# Altium footprint library Connectors USB.PcbLib: 22 footprints (part 1 of 2)
Each footprint in its own frame and in the unit in brackets; x right, y up, seen from the top. Pads: shape width x height; smd on the part's side, far side on the other; paste and mask are expansions set on the pad; w line width, h text height; cw(c..) or ccw(c..) is an arc to the next point about the centre after c.
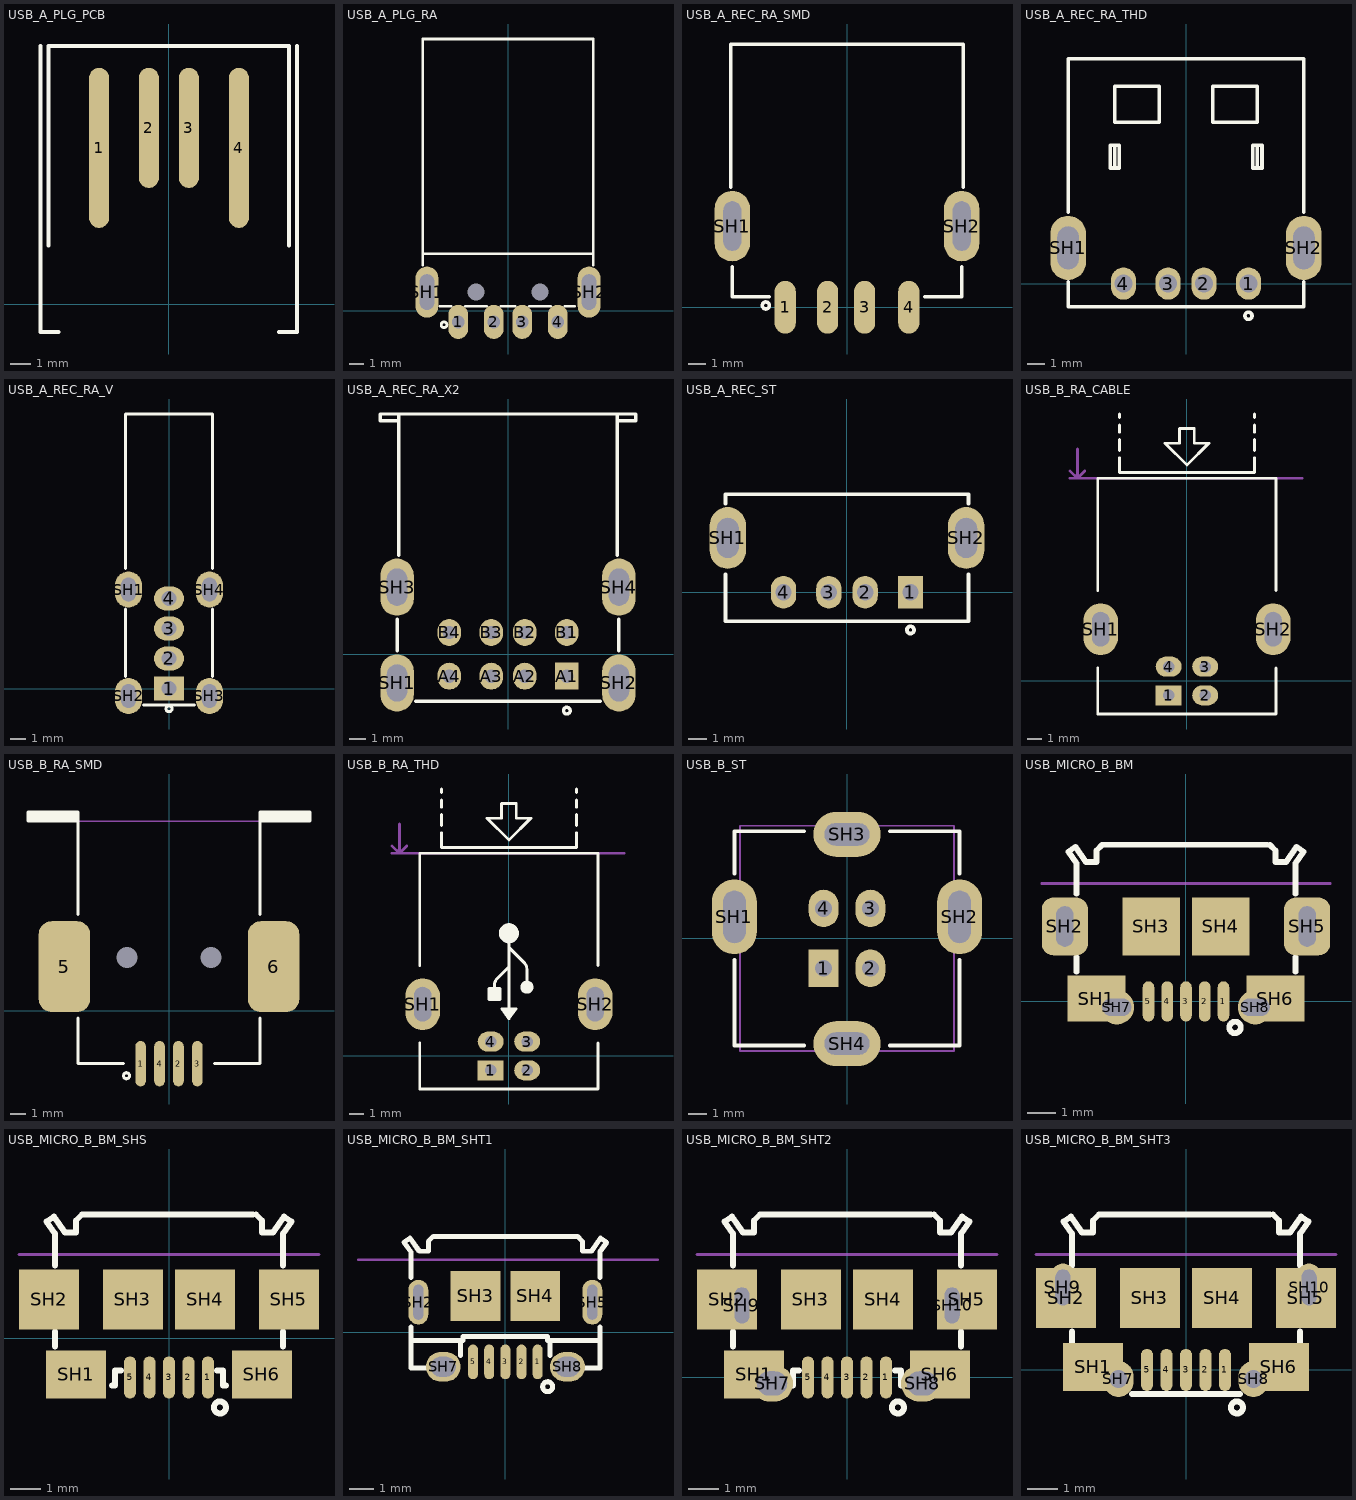
[diagram p0: the footprints below, top view; thin cyan lines are the x and y axes]

## USB_A_PLG_PCB [mm]
height 6.5
pads (4):
  oval 1x8 smd: 1(-3.485,7.8) 4(3.5,7.8)
  oval 1x6 smd: 2(-1,8.8) 3(1,8.8)
Top Overlay:
  lines w0.2: -6.4,12.9 -6.4,-1.4 -5.5,-1.4 ; -6,2.933 -6,12.9 6,12.9 6,2.933 ; 5.5,-1.4 6.4,-1.4 6.4,12.9

## USB_A_PLG_RA [mm] "CONN, USB, Type A, PLUG, Right Angle, SMD, THD"
height 4.5
pads (8):
  oval 1.4x2.4 / inner oval 1.4x1.8 / far side oval 1.4x1.8 hole 0.9 mask+0.1: 1(-3.5,-0.8) 2(-1,-0.8) 3(1,-0.8) 4(3.5,-0.8)
  oval 1.6x3.6 hole 1 slot 2.5 at 90 deg: SH1(-5.7,1.3) SH2(5.7,1.3)
  round 0.8 hole 1.2 unplated: ""(-2.25,1.3) ""(2.25,1.3)
Top Overlay:
  circle w0.2: c-4.5,-1 r0.2
  lines w0.2: -6,3.2 -6,19.1 6,19.1 6,3.2 ; -6,4 6,4 ; -4.8,0.3 -4,0.3 ; -3,0.3 -1.5,0.3 ; -0.5,0.3 0.5,0.3 ; 1.5,0.3 3,0.3 ; 4,0.3 4.7,0.3
Mechanical 1:
  lines w0.1: -6,4 6,4
  text "PCB Edge" at 5.173,4.473 h0.25
3D body "14381.STEP": height 3.13, standoff -2.67, extent -6.303,-1.3 6.303,19

## USB_A_REC_RA_SMD [mm] "CONN, USB A, Receptacle, RIGHT ANGLE, SMD"
pads (6):
  oval 1.2x3 smd: 1(-3.5,0) 2(-1.1,0) 3(1,0) 4(3.5,0)
  oval 2x4 hole 1 slot 2.8 at 90 deg: SH1(-6.5,4.6) SH2(6.5,4.6)
Top Overlay:
  circle w0.2: c-4.6,0.1 r0.2
  lines w0.2: -6.6,6.8 -6.6,14.9 6.6,14.9 6.6,6.8 ; -6.5,2.3 -6.5,0.6 -4.4,0.6 ; 4.4,0.6 6.5,0.6 6.5,2.3
3D body "USB MADEGI SMD .stp": height 7.7, standoff -2.62, extent -7.3,-0.206 7.2,14.806

## USB_A_REC_RA_THD [mm] "CONN, USB A, Receptacle, RIGHT ANGLE, THD"
height 7
pads (6):
  oval 1.4x1.8 hole 1: 1(3.5,0) 2(1,0) 3(-1,0) 4(-3.5,0)
  oval 2x3.6 hole 1.2 slot 2.4 at 90 deg: SH1(-6.6,2) SH2(6.6,2)
Top Overlay:
  circle w0.2: c3.5,-1.8 r0.2
  lines w0.2: -6.6,0.1 -6.6,-1.3 6.6,-1.3 6.6,0.1 ; -6.6,4 -6.6,12.6 6.6,12.6 6.6,4 ; -3.995,6.475 -4.249,6.475 -4.249,7.745 -3.995,7.745 ; -3.995,6.475 -3.741,6.475 -3.741,7.745 -3.995,7.745 ; -3.995,6.475 -3.995,7.745 ; 4,6.475 3.746,6.475 3.746,7.745 4,7.745 ; 4,6.475 4.255,6.475 4.255,7.745 4,7.745 ; 4,6.475 4,7.745 ; -3.995,9.047 -3.995,11.047 -1.495,11.047 -1.495,9.047 -3.995,9.047 ; 1.5,9.047 1.5,11.047 4,11.047 4,9.047 1.5,9.047
3D body "User Library-USB-A-01.step": height 6.95, standoff -4.2, extent -7.9,-1.2 7.9,12.5

## USB_A_REC_RA_V [mm] "CONN, USB A, Right Angle, VERTICAL, THD"
height 13.83
pads (8):
  rect 2x1.6 hole 1: 1(0,0)
  oval 2x1.6 hole 1: 2(0,2) 3(0,4) 4(0,6)
  oval 1.8x2.4 hole 1 slot 1.6 at 90 deg: SH1(-2.7,6.6) SH2(-2.7,-0.5) SH3(2.7,-0.5) SH4(2.7,6.6)
Top Overlay:
  circle w0.2: c0,-1.35 r0.2
  lines w0.2: -2.9,0.8 -2.9,5.3 ; -2.9,8 -2.9,18.3 2.9,18.3 2.9,8 ; -1.7,-1.1 1.7,-1.1 ; 2.9,0.8 2.9,5.3
3D body "usb_a-usb_a-e.stp": height 14.25, standoff -3.9, extent -3.556,-1.025 3.564,18.225

## USB_A_REC_RA_X2 [mm] "CONN, USB A, Right Angle, DUAL"
height 15.82
pads (12):
  rect 1.4x1.6 hole 0.8: A1(3.5,-1.3)
  oval 1.4x1.6 hole 0.8: A2(1,-1.3) A3(-1,-1.3) A4(-3.5,-1.3) B1(3.5,1.3) B2(1,1.3) B3(-1,1.3) B4(-3.5,1.3)
  oval 2x3.4 hole 1.2 slot 2.2 at 90 deg: SH1(-6.6,-1.7) SH2(6.6,-1.7) SH3(-6.6,4) SH4(6.6,4)
Top Overlay:
  circle w0.2: c3.5,-3.35 r0.2
  lines w0.2: -6.6,0.2 -6.6,2.1 ; -6.5,5.9 -6.5,14.3 ; -6.5,13.9 -7.6,13.9 -7.6,14.3 -6.5,14.3 ; -5.5,-2.8 5.5,-2.8 ; 6.5,5.9 6.5,14.3 ; 6.5,13.9 7.6,13.9 7.6,14.3 6.5,14.3 ; 6.6,0.2 6.6,2.1 ; -6.5,14.3 6.5,14.3
Mechanical 1:
  lines w0.1: -6.57,14.3 6.57,14.3
  text "PCB Edge" at 6.15,13.932 h0.2
3D body "14378.STEP": height 16.3, standoff -3.1, extent -7.851,-2.7 7.849,14.898

## USB_A_REC_ST [mm] "CONN, USB A, Receptacle, STRAIGHT, THD"
height 15
pads (6):
  rect 1.4x1.8 hole 0.9: 1(3.5,0)
  oval 1.4x1.8 hole 0.9: 2(1,0) 3(-1,0) 4(-3.5,0)
  oval 2x3.4 hole 1.2 slot 2.2 at 90 deg: SH1(-6.57,3) SH2(6.57,3)
Top Overlay:
  circle w0.2: c3.5,-2.075 r0.2
  lines w0.2: -6.7,1 -6.7,-1.6 6.7,-1.6 6.7,1 ; -6.7,4.9 -6.7,5.4 6.7,5.4 6.7,4.9
3D body "14382.STEP": height 14, standoff -3.99, extent -7.992,-2.365 7.992,5.275

## USB_B_RA_CABLE [mm] "CONN, USB B, Receptacle, RIGHT ANGLE, THD"
height 11.1
pads (6):
  rect 1.8x1.4 hole 0.8: 1(-1.27,-1)
  oval 1.8x1.4 hole 0.8: 2(1.27,-1) 3(1.27,1) 4(-1.27,1)
  oval 2.4x3.6 hole 1.2 slot 2.4 at 90 deg: SH1(-6,3.6) SH2(6,3.6)
Top Overlay:
  lines w0.2: -6.2,0.9 -6.2,-2.3 6.2,-2.3 6.2,0.9 ; -6.2,6.3 -6.2,14.1 6.2,14.1 6.2,6.3 ; -4.699,15.524 -4.699,14.508 4.699,14.508 4.699,15.524 ; -4.699,16.032 -4.699,16.794 ; -4.699,17.302 -4.699,17.81 ; -4.699,18.318 -4.699,18.572 ; 4.699,16.032 4.699,16.794 ; 4.699,17.302 4.699,17.81 ; 4.699,18.318 4.699,18.572 ; -1.524,16.54 0,15.016 1.524,16.54 0.508,16.54 0.508,17.556 -0.508,17.556 -0.508,16.54 -1.524,16.54
Mechanical 1:
  lines w0.2: -8.128,14.1 8.001,14.1 ; -8.128,14.608 -7.62,14.1 ; -7.62,16.132 -7.62,14.1 ; -7.112,14.608 -7.62,14.1
  text "Edge of Board" at -6.6,14.8 h1
3D body "User Library-Samtec - USB-B-S-X-W-TH.STEP": height 11.1, standoff -3.54, extent -7.454,-2.522 7.345,13.978
3D body "Samtec-DEFAULT.STEP": height 11.05, standoff 0.55, extent -5.575,2.582 5.625,68.532

## USB_B_RA_SMD [mm] "CONN, USB B, Receptacle, RIGHT ANGLE, SMD"
height 11
pads (8):
  oval 0.7x3 smd mask+0.075: 1(-1.875,-3.5) 2(0.625,-3.5) 3(1.875,-3.5) 4(-0.625,-3.5)
  rrect50% 3.4x6 smd: 5(-6.9,2.9) 6(6.9,2.9)
  round 1.1 hole 1.4 unplated: ""(-2.775,3.5) ""(2.775,3.5)
Top Overlay:
  circle w0.2: c-2.8,-4.3 r0.2
  region: 9.32,12.5 9.32,13.1 6.02,13.1 6.02,12.5
  region: -6.02,12.5 -6.02,13.1 -9.32,13.1 -9.32,12.5
  lines w0.2: -6.02,-0.5 -6.02,-3.5 -3,-3.5 ; -6.02,6.34 -6.02,12.5 ; 3,-3.5 6.02,-3.5 6.02,-0.5 ; 6.02,6.34 6.02,12.5 ; -6.02,12.5 -6.02,13.1 -9.32,13.1 -9.32,12.5 -6.02,12.5 ; 6.02,12.5 6.02,13.1 9.32,13.1 9.32,12.5 6.02,12.5
Mechanical 1:
  lines w0.1: -6.02,12.5 6.02,12.5
  text "PCB Edge" at 5.75,12.281 h0.25
3D body "14383.STEP": height 11, standoff -1.5, extent -8.097,-4.635 8.103,12.515
3D body "Samtec-DEFAULT.STEP": height 11.05, standoff 0.55, extent -5.702,3.305 5.498,69.255

## USB_B_RA_THD [mm] "CONN, USB B, Receptacle, RIGHT ANGLE, THD"
pads (6):
  rect 1.8x1.4 hole 0.8: 1(-1.27,-1)
  oval 1.8x1.4 hole 0.8: 2(1.27,-1) 3(1.27,1) 4(-1.27,1)
  oval 2.4x3.6 hole 1.2 slot 2.4 at 90 deg: SH1(-6,3.6) SH2(6,3.6)
Top Overlay:
  circle w0.508: c1.25,4.785 r0.2
  circle w0.889: c0,8.535 r0.254
  region: -1.375,3.935 -1.375,4.685 -0.625,4.685 -0.625,3.935
  region: 0,2.585 -0.5,3.285 0.5,3.285
  lines w0.2: -6.2,0.9 -6.2,-2.3 6.2,-2.3 6.2,0.9 ; -6.2,6.3 -6.2,14.1 6.2,14.1 6.2,6.3 ; -4.699,15.524 -4.699,14.508 4.699,14.508 4.699,15.524 ; -4.699,16.032 -4.699,16.794 ; -4.699,17.302 -4.699,17.81 ; -4.699,18.318 -4.699,18.572 ; -1,4.685 -1,4.935 cw(c-0.36,4.935) -0.812,5.388 -0.062,6.138 ; 0,3.285 0,8.035 ; 0.062,7.488 1.062,6.488 cw(c0.61,6.035) 1.25,6.035 1.25,4.785 ; 4.699,16.032 4.699,16.794 ; 4.699,17.302 4.699,17.81 ; 4.699,18.318 4.699,18.572 ; -1.524,16.54 0,15.016 1.524,16.54 0.508,16.54 0.508,17.556 -0.508,17.556 -0.508,16.54 -1.524,16.54 ; -1.375,3.935 -0.625,3.935 -0.625,4.685 -1.375,4.685 -1.375,3.935 ; -0.5,3.285 0.5,3.285 0,2.585 -0.5,3.285
Mechanical 1:
  lines w0.2: -8.128,14.1 8.001,14.1 ; -8.128,14.608 -7.62,14.1 ; -7.62,16.132 -7.62,14.1 ; -7.112,14.608 -7.62,14.1
  text "Edge of Board" at -6.6,14.8 h1
3D body "User Library-Samtec - USB-B-S-X-W-TH.STEP": height 11.1, standoff -3.54, extent -7.454,-2.522 7.345,13.978

## USB_B_ST [mm] "CONN, USB B, Receptacle, STRAIGHT, THD"
height 15.62
pads (8):
  rect 1.6x2 hole 0.9: 1(-1.25,-1.6)
  oval 1.6x2 hole 0.9: 2(1.25,-1.6) 3(1.25,1.6) 4(-1.25,1.6)
  oval 2.4x4 hole 1.2 slot 2.8 at 90 deg: SH1(-6.02,1.15) SH2(6.02,1.15)
  oval 3.6x2.4 hole 1.2 slot 2.4 at 0 deg: SH3(0,5.56) SH4(0,-5.63)
Top Overlay:
  lines w0.2: -6.02,-1.15 -6.02,-5.73 -2.3,-5.73 ; -6.02,3.45 -6.02,5.73 -2.3,5.73 ; 2.3,-5.73 6.02,-5.73 6.02,-1.15 ; 2.3,5.73 6.02,5.73 6.02,3.45
Mechanical 13:
  lines w0.1: -5.73,-6.02 5.73,-6.02 5.73,6.02 -5.73,6.02 -5.73,-6.02
3D body "5881.STEP": height 15.8, standoff -4.74, extent -7.55,-5.65 7.548,5.85

## USB_MICRO_B_BM [mm] "CONN, USB Micro AB - Standard (Bottom mount), Shell THD, G610"
pads (13):
  oval 0.4x1.4 smd mask+0.05: 1(1.3,0) 2(0.65,0) 3(0,0) 4(-0.65,0) 5(-1.3,0)
  rect 2x1.6 smd: SH1(-3.1,0.1) SH6(3.1,0.1)
  rrect50% 1.6x2 / inner oval 0.8x1.6 / far side oval 0.8x1.6 hole 0.6 slot 1.4 at 90 deg: SH2(-4.2,2.6) SH5(4.2,2.6)
  rect 2x2 smd: SH3(-1.2,2.6) SH4(1.2,2.6)
  round 1.2 hole 0.6 slot 1 at 0 deg mask+0.05: SH7(-2.4,-0.2) SH8(2.4,-0.2)
Top Overlay:
  circle w0.2: c1.7,-0.9 r0.2
  lines w0.2: -3.8,1.03 -3.8,1.53 ; -3.8,3.73 -3.8,4.791 -4.078,5.192 -3.831,5.363 -3.462,4.83 -3.1,4.83 -3.1,5.23 -2.9,5.43 2.8,5.43 ; 2.9,5.43 3.1,5.23 3.1,4.83 3.462,4.83 3.831,5.363 4.078,5.192 3.8,4.791 3.8,3.73 ; 3.8,1.03 3.8,1.53
Mechanical 1:
  lines w0.1: -5,4.092 5,4.092
  text "PCB EDGE" at -2.7,4.4 h0.8
3D body "475890001.stp": height 2.76, standoff -0.58, extent -4.325,-0.37 4.325,5.425

## USB_MICRO_B_BM_SHS [mm] "CONN, USB Micro AB - Standard (Bottom mount), Shell SMT"
height 2.8
pads (11):
  oval 0.4x1.4 smd: 1(1.3,-1.3) 2(0.65,-1.3) 3(0,-1.3) 4(-0.65,-1.3) 5(-1.3,-1.3)
  rect 2x1.6 smd: SH1(-3.1,-1.2) SH6(3.1,-1.2)
  rect 2x2 smd: SH2(-4,1.3) SH3(-1.2,1.3) SH4(1.2,1.3) SH5(4,1.3)
Top Overlay:
  circle w0.2: c1.7,-2.3 r0.2
  lines w0.2: -3.8,-0.27 -3.8,0.23 ; -3.8,2.43 -3.8,3.491 -4.078,3.892 -3.831,4.063 -3.462,3.53 -3.1,3.53 -3.1,3.93 -2.9,4.13 2.8,4.13 ; -1.9,-1.57 -1.8,-1.57 -1.8,-1.07 -1.6,-1.07 ; 1.6,-1.07 1.8,-1.07 1.8,-1.57 1.9,-1.57 ; 2.9,4.13 3.1,3.93 3.1,3.53 3.462,3.53 3.831,4.063 4.078,3.892 3.8,3.491 3.8,2.43 ; 3.8,-0.27 3.8,0.23
Mechanical 1:
  lines w0.1: -5,2.792 5,2.792
  text "PCB EDGE" at -2.7,3.1 h0.8
3D body "c-1981584-1-f-3d.stp": height 2.78, standoff -0.28, extent -4.4,-1.609 4.4,3.991

## USB_MICRO_B_BM_SHT1 [mm] "CONN, USB Micro AB - Standard (Bottom mount), Shell through hole"
height 2.8
pads (11):
  oval 0.4x1.4 smd: 1(1.3,-1.2) 2(0.65,-1.2) 3(0,-1.2) 4(-0.65,-1.2) 5(-1.3,-1.2)
  oval 0.8x1.8 hole 0.4 slot 1.4 at 90 deg: SH2(-3.5,1.2) SH5(3.5,1.2)
  rect 2x2 smd: SH3(-1.2,1.45) SH4(1.2,1.45)
  oval 1.4x1.2 hole 0.8 slot 1 at 0 deg mask+0.05: SH7(-2.5,-1.4) SH8(2.5,-1.4)
Top Overlay:
  circle w0.2: c1.7,-2.2 r0.2
  lines w0.2: -3.8,-0.35 -1.7,-0.35 -1.7,-0.186 0,-0.186 1.7,-0.186 1.7,-0.35 3.8,-0.35 ; -3.8,0.2 -3.8,-1.45 -2.9,-1.45 ; -3.8,2.2 -3.8,3.211 -4.078,3.612 -3.831,3.783 -3.462,3.25 -3.1,3.25 -3.1,3.65 -2.9,3.85 2.9,3.85 3.1,3.65 3.1,3.25 3.462,3.25 3.831,3.783 4.078,3.612 3.8,3.211 3.8,2.2 ; -1.8,-0.95 -1.8,-0.35 ; 1.8,-0.95 1.8,-0.35 ; 2.9,-1.45 3.8,-1.45 3.8,0.2
Mechanical 1:
  lines w0.1: -5.928,2.912 6.142,2.912
  text "PCB EDGE" at -1.9,3.1 h0.6
3D body "User Library-MicroUSB-B_Molex_105017-0001.step": height 2.68, standoff -0.63, extent -4.1,-1.65 4.1,3.78

## USB_MICRO_B_BM_SHT2 [mm] "CONN, USB Micro AB - Standard (Bottom mount), Shell SMT"
height 2.8
pads (15):
  oval 0.4x1.4 smd: 1(1.3,0) 2(0.65,0) 3(0,0) 4(-0.65,0) 5(-1.3,0)
  rect 2x1.6 smd: SH1(-3.1,0.1) SH6(3.1,0.1)
  rect 2x2 smd: SH2(-4,2.6) SH3(-1.2,2.6) SH4(1.2,2.6) SH5(4,2.6)
  oval 1.4x1.2 hole 0.8 slot 1 at 0 deg mask+0.05: SH7(-2.5,-0.2) SH8(2.5,-0.2)
  oval 0.8x1.6 hole 0.5 slot 1.2 at 90 deg: SH9(-3.5,2.4) SH10(3.5,2.4)
Top Overlay:
  circle w0.2: c1.7,-1 r0.2
  lines w0.2: -3.8,1.03 -3.8,1.53 ; -3.8,3.73 -3.8,4.791 -4.078,5.192 -3.831,5.363 -3.462,4.83 -3.1,4.83 -3.1,5.23 -2.9,5.43 2.8,5.43 ; -1.9,-0.27 -1.8,-0.27 -1.8,0.23 -1.6,0.23 ; 1.6,0.23 1.8,0.23 1.8,-0.27 1.9,-0.27 ; 2.9,5.43 3.1,5.23 3.1,4.83 3.462,4.83 3.831,5.363 4.078,5.192 3.8,4.791 3.8,3.73 ; 3.8,1.03 3.8,1.53
Mechanical 1:
  lines w0.1: -5,4.092 5,4.092
  text "PCB EDGE" at -2.7,4.4 h0.8
3D body "User Library-MicroUSB-B_Molex_105017-0001.step": height 2.68, standoff -0.63, extent -4.1,-0.45 4.1,4.98

## USB_MICRO_B_BM_SHT3 [mm] "CONN, USB Micro AB - Standard (Bottom mount), Shell THD, Hirsoe ZX62D-AB-5P8"
height 2.8
pads (15):
  oval 0.4x1.4 smd: 1(1.3,0) 2(0.65,0) 3(0,0) 4(-0.65,0) 5(-1.3,0)
  rect 2x1.6 smd: SH1(-3.1,0.1) SH6(3.1,0.1)
  rect 2x2 smd: SH2(-4,2.4) SH3(-1.2,2.4) SH4(1.2,2.4) SH5(4,2.4)
  oval 1x1.2 hole 0.6 mask+0.05: SH7(-2.25,-0.3) SH8(2.25,-0.3)
  oval 0.8x1.6 hole 0.5 slot 1.2 at 90 deg: SH9(-4.1,2.75) SH10(4.1,2.75)
Top Overlay:
  circle w0.2: c1.7,-1.25 r0.2
  lines w0.2: -3.8,0.78 -3.8,1.28 ; -3.8,3.48 -3.8,4.541 -4.078,4.942 -3.831,5.113 -3.462,4.58 -3.1,4.58 -3.1,4.98 -2.9,5.18 2.8,5.18 ; -1.8,-0.8 1.8,-0.8 ; 2.9,5.18 3.1,4.98 3.1,4.58 3.462,4.58 3.831,5.113 4.078,4.942 3.8,4.541 3.8,3.48 ; 3.8,0.78 3.8,1.28
Mechanical 1:
  lines w0.1: -5,3.842 5,3.842
  text "PCB EDGE" at -2.7,4.15 h0.8
3D body "ZX62D-AB-5P8.stp": height 2.75, standoff -0.64, extent -4.325,-0.55 4.325,5.349